# Altium footprint library Wurth_Elektronik_Electromechanic_Wire_to_Board_Connectors_rev16a.PCBLIB: 662 footprints (part 30 of 42)
Each footprint in its own frame and in the unit in brackets; x right, y up, seen from the top. Pads: shape width x height; smd on the part's side, far side on the other; paste and mask are expansions set on the pad; w line width, h text height; cw(c..) or ccw(c..) is an arc to the next point about the centre after c.
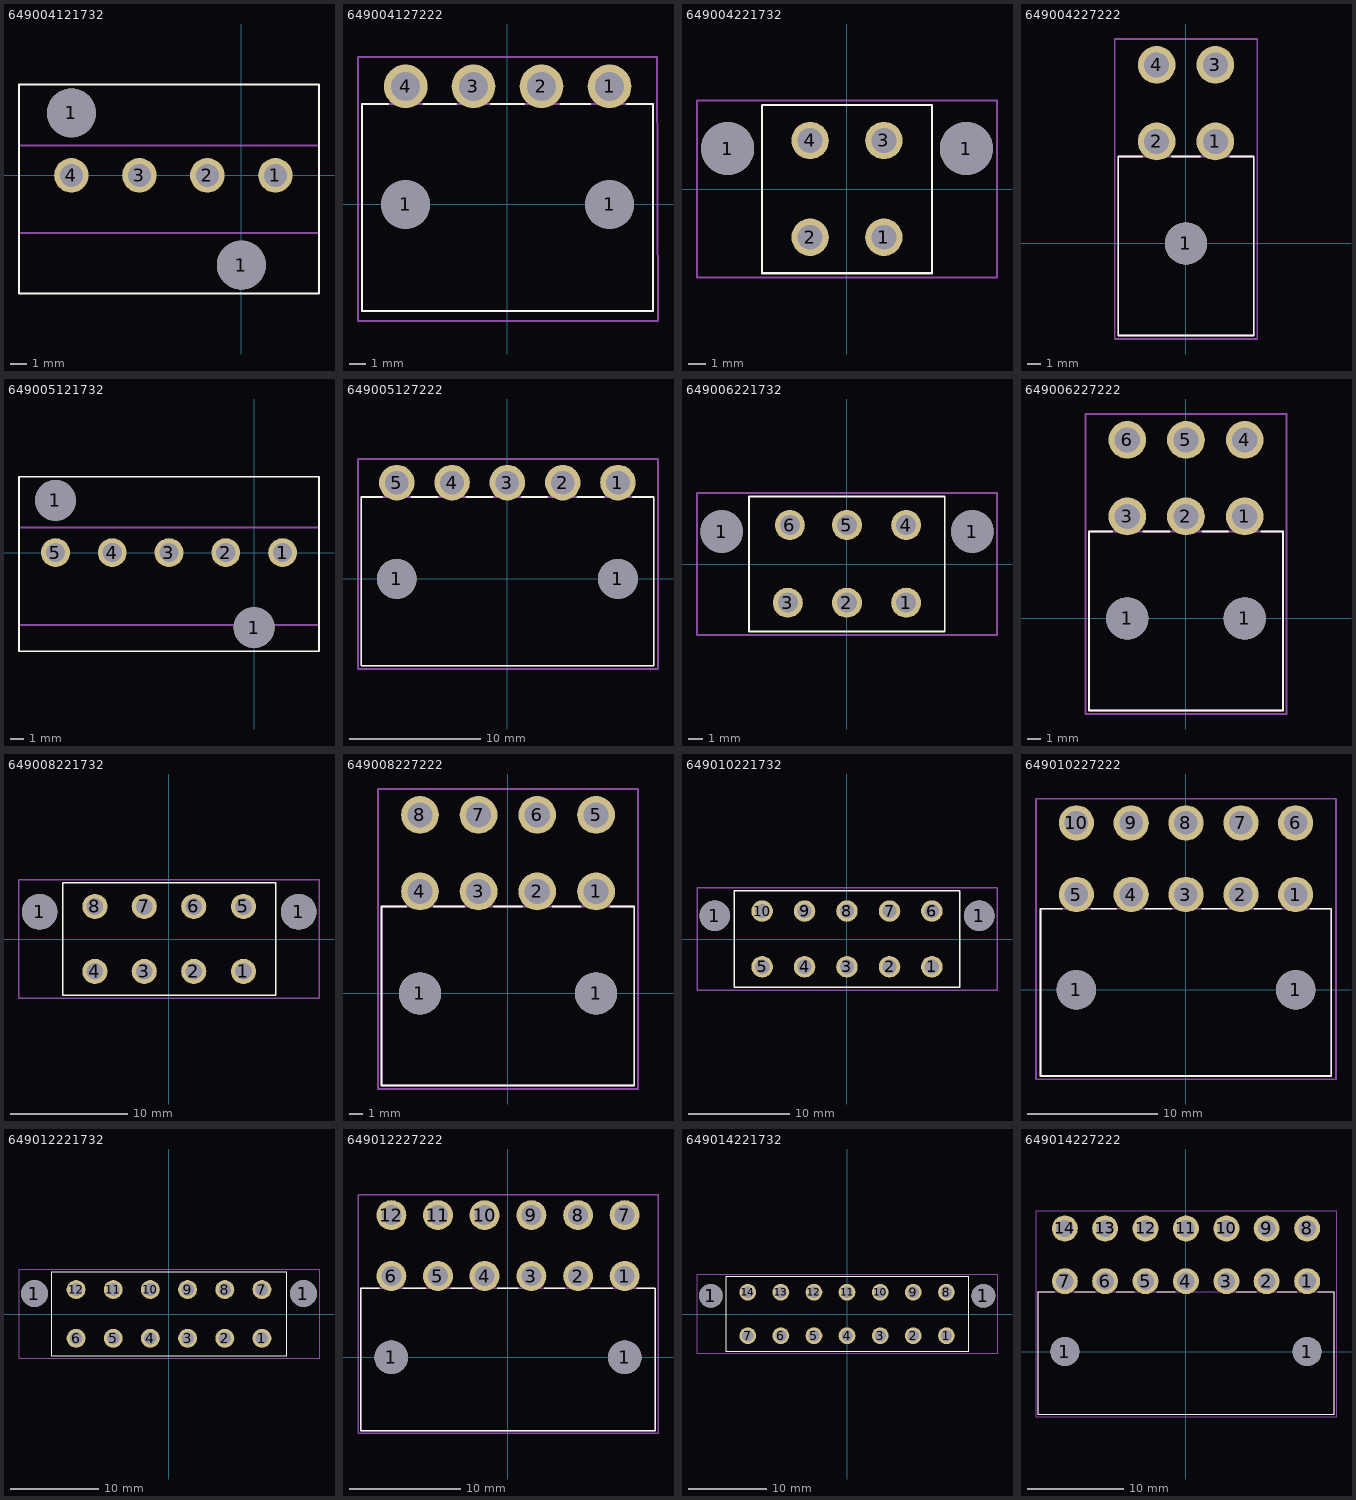
[diagram p29: the footprints below, top view; thin cyan lines are the x and y axes]

## 649004121732 [mil]
pads (6):
  round 119 hole 119: 1(-413.39,152) 1(0,-218.5)
  round 84 hole 56: 1(83,0) 2(-82.68,0) 3(-248.03,0) 4(-413.39,0)
Top Overlay:
  lines w5: -540.94,-287.4 189,-287.4 189,221 -540.94,221 -540.94,-287.4
Mechanical 2:
  text ">NAME" at -300,250 h77.5
Mechanical 4:
  text ">VALUE" at -300,-350 h77.5
Mechanical 16:
  lines w5: -540.94,-139.76 189,-139.76 189,73 -540.94,73 -540.94,-139.76
  text "1" at 75,-25 h77.5
  text "4" at -434.65,-25 h77.5

## 649004127222 [mil]
pads (6):
  round 119 hole 119: 1(-248.03,0) 1(249,0)
  round 106.5 hole 71: 1(249,288) 2(83,288) 3(-82.68,288) 4(-248.03,288)
Top Overlay:
  lines w5: -291.34,245 -354.33,245 -354.33,-259.84 355,-259.84 355,245 292,245 ; -204.72,245 -125.98,245 ; -39.37,245 40,245 ; 130,245 201,245
Mechanical 2:
  text ">NAME" at -109.65,388 h77.5
Mechanical 4:
  text ">VALUE" at -134.65,-362.6 h77.5
Mechanical 16:
  lines w5: -354.33,-259.84 -354.33,245 355,245 355,-259.84 -354.33,-259.84
  text "1" at 241,263 h77.5
  text "4" at -259.65,263 h77.5
Mechanical 27:
  lines w5: -364.17,-283.46 367,-283.46 365,359 -364.17,359 -364.17,-283.46

## 649004221732 [mil]
pads (6):
  round 119 hole 119: 1(-267.72,91) 1(268,91)
  round 84 hole 56: 1(83,-108.27) 2(-82.68,-108.27) 3(83,109) 4(-82.68,109)
Top Overlay:
  lines w5: -190.94,-188.98 191,-188.98 191,189 -190.94,189 -190.94,-188.98
Mechanical 2:
  text ">NAME" at -100.59,217 h77.5
Mechanical 4:
  text ">VALUE" at -142.72,-277.36 h77.5
Mechanical 16:
  text "1" at 58,-125 h77.5
  text "4" at -107.68,85 h77.5
Mechanical 27:
  lines w5: -336.61,-198.82 337,-198.82 337,199 -336.61,199 -336.61,-198.82

## 649004227222 [mil]
pads (5):
  round 119 hole 119: 1(0,0)
  round 106.5 hole 71: 1(83,288) 2(-82.68,288) 3(83,504) 4(-82.68,504)
Top Overlay:
  lines w5: -124.02,245 -190.94,245 -190.94,-259.84 191,-259.84 191,245 126,245 ; -39.37,245 40,245
Mechanical 2:
  text ">NAME" at -479.04,37 h77.5
Mechanical 4:
  text ">VALUE" at -500,-54.33 h77.5
Mechanical 16:
  lines w5: -190.94,-259.84 191,-259.84 191,245 -190.94,245 -190.94,-259.84
  text "1" at 78,264 h77.5
  text "4" at -107.68,477 h77.5
Mechanical 27:
  lines w5: -200.79,-269.69 201,-269.69 201,577 -200.79,577 -200.79,-269.69

## 649005121732 [mil]
pads (7):
  round 119 hole 119: 1(-578.74,152) 1(0,-218.5)
  round 84 hole 56: 1(83,0) 2(-82.68,0) 3(-248.03,0) 4(-413.39,0) 5(-578.74,0)
Top Overlay:
  lines w5: -685.04,-287.4 189,-287.4 189,221 -685.04,221 -685.04,-287.4
Mechanical 2:
  text ">NAME" at -375,250 h77.5
Mechanical 4:
  text ">VALUE" at -400,-350 h77.5
Mechanical 16:
  lines w5: -685.04,-210.63 189,-210.63 189,73 -685.04,73 -685.04,-210.63
  text "1" at 75,-25 h77.5
  text "5" at -584.65,-25 h77.5

## 649005127222 [mil]
pads (7):
  round 119 hole 119: 1(-330.71,0) 1(331,0)
  round 106.5 hole 71: 1(331,288) 2(166,288) 3(0,288) 4(-165.35,288) 5(-330.71,288)
Top Overlay:
  lines w5: -374.02,245 -437.01,245 -437.01,-259.84 438,-259.84 438,245 375,245 ; -287.4,245 -208.66,245 ; -122.05,245 -43.31,245 ; 44,245 119,245 ; 209,245 288,245
Mechanical 2:
  text ">NAME" at -151.97,388 h77.5
Mechanical 4:
  text ">VALUE" at -151.97,-340.16 h77.5
Mechanical 16:
  lines w5: -437.01,-259.84 -437.01,245 438,245 438,-259.84 -437.01,-259.84
  text "1" at 324,263 h77.5
  text "5" at -351.97,263 h77.5
Mechanical 27:
  lines w5: -446.85,-269.69 451,-269.69 451,359 -446.85,359 -446.85,-269.69

## 649006221732 [mil]
pads (8):
  round 119 hole 119: 1(-350.39,91) 1(351,91)
  round 84 hole 56: 1(166,-108.27) 2(0,-108.27) 3(-165.35,-108.27) 4(166,109) 5(0,109) 6(-159.65,109)
Top Overlay:
  lines w5: -273.62,-188.98 274,-188.98 274,189 -273.62,189 -273.62,-188.98
Mechanical 2:
  text ">NAME" at -137.6,225 h77.5
Mechanical 4:
  text ">VALUE" at -142.91,-273.43 h77.5
Mechanical 16:
  text "1" at 141,-125 h77.5
  text "6" at -175,85 h77.5
Mechanical 27:
  lines w5: -419.29,-198.82 420,-198.82 420,199 -419.29,199 -419.29,-198.82

## 649006227222 [mil]
pads (8):
  round 119 hole 119: 1(-165.35,0) 1(166,0)
  round 106.5 hole 71: 1(166,288) 2(0,288) 3(-165.35,288) 4(166,504) 5(0,504) 6(-165.35,504)
Top Overlay:
  lines w5: -208.66,245 -273.62,245 -273.62,-259.84 274,-259.84 274,245 213,245 ; -120.08,245 -45.28,245 ; 46,245 119,245
Mechanical 2:
  text ">NAME" at -628.44,37 h77.5
Mechanical 4:
  text ">VALUE" at -628.44,-42.62 h77.5
Mechanical 16:
  lines w5: -273.62,-259.84 274,-259.84 274,245 -273.62,245 -273.62,-259.84
  text "6" at -192.91,471 h77.5
  text "1" at 161,264 h77.5
Mechanical 27:
  lines w5: -283.46,-269.69 284,-269.69 284,577 -283.46,577 -283.46,-269.69

## 649008221732 [mil]
pads (10):
  round 119 hole 119: 1(-433.07,91) 1(434,91)
  round 84 hole 56: 1(249,-108.27) 2(83,-108.27) 3(-82.68,-108.27) 4(-248.03,-108.27) 5(249,109) 6(83,109) 7(-82.68,109) 8(-248.03,109)
Top Overlay:
  lines w5: -356.3,-188.98 357,-188.98 357,189 -356.3,189 -356.3,-188.98
Mechanical 2:
  text ">NAME" at -110.24,217 h77.5
Mechanical 4:
  text ">VALUE" at -143.11,-265.55 h77.5
Mechanical 16:
  text "1" at 224,-125 h77.5
  text "8" at -267.32,85 h77.5
Mechanical 27:
  lines w5: -501.97,-198.82 502,-198.82 502,199 -501.97,199 -501.97,-198.82

## 649008227222 [mil]
pads (10):
  round 119 hole 119: 1(-248.03,0) 1(249,0)
  round 106.5 hole 71: 1(249,288) 2(83,288) 3(-82.68,288) 4(-248.03,288) 5(249,504) 6(83,504) 7(-82.68,504) 8(-248.03,504)
Top Overlay:
  lines w5: -287.4,245 -356.3,245 -356.3,-259.84 357,-259.84 357,245 ; -208.66,245 -124.02,245 ; -39.37,245 40,245 ; 126,245 205,245 ; 290,245 355,245
Mechanical 2:
  text ">NAME" at -638.68,37 h77.5
Mechanical 4:
  text ">VALUE" at -663.68,-42.62 h77.5
Mechanical 16:
  lines w5: -356.3,-259.84 357,-259.84 357,245 -356.3,245 -356.3,-259.84
  text "8" at -260.24,471 h77.5
  text "1" at 161,264 h77.5
Mechanical 27:
  lines w5: -366.14,-269.69 367,-269.69 367,577 -366.14,577 -366.14,-269.69

## 649010221732 [mil]
pads (12):
  round 119 hole 119: 1(-515.75,91) 1(516,91)
  round 84 hole 56: 1(331,-108.27) 2(166,-108.27) 3(0,-108.27) 4(-165.35,-108.27) 5(-330.71,-108.27) 6(331,109) 7(166,109) 8(0,109) 9(-165.35,109) 10(-330.71,109)
Top Overlay:
  lines w5: -438.98,-188.98 439,-188.98 439,189 -438.98,189 -438.98,-188.98
Mechanical 2:
  text ">NAME" at -102.56,245 h77.5
Mechanical 4:
  text ">VALUE" at -119.69,-289.17 h77.5
Mechanical 16:
  text "1" at 306,-125 h77.5
  text "10" at -384.65,85 h77.5
Mechanical 27:
  lines w5: -584.65,-198.82 585,-198.82 585,199 -584.65,199 -584.65,-198.82

## 649010227222 [mil]
pads (12):
  round 119 hole 119: 1(-330.71,0) 1(331,0)
  round 106.5 hole 71: 1(331,288) 2(166,288) 3(0,288) 4(-165.35,288) 5(-330.71,288) 6(331,504) 7(166,504) 8(0,504) 9(-165.35,504) 10(-330.71,504)
Top Overlay:
  lines w5: -374.02,245 -438.98,245 -438.98,-259.84 439,-259.84 439,245 375,245 ; -285.43,245 -210.63,245 ; -122.05,245 -43.31,245 ; 48,245 123,245 ; 207,245 288,245
Mechanical 2:
  text ">NAME" at -721.36,37 h77.5
Mechanical 4:
  text ">VALUE" at -746.36,-42.62 h77.5
Mechanical 16:
  lines w5: -438.98,-259.84 439,-259.84 439,245 -438.98,245 -438.98,-259.84
  text "10" at -377.56,471 h77.5
  text "1" at 326,264 h77.5
Mechanical 27:
  lines w5: -452.76,-269.69 453,-269.69 453,577 -452.76,577 -452.76,-269.69

## 649012221732 [mil]
pads (14):
  round 119 hole 119: 1(-598.43,91) 1(599,91)
  round 84 hole 56: 1(414,-108.27) 2(249,-108.27) 3(83,-108.27) 4(-82.68,-108.27) 5(-248.03,-108.27) 6(-413.39,-108.27) 7(414,109) 8(249,109) 9(83,109) 10(-82.68,109) 11(-248.03,109) 12(-413.39,109)
Top Overlay:
  lines w5: -521.65,-188.98 522,-188.98 522,189 -521.65,189 -521.65,-188.98
Mechanical 2:
  text ">NAME" at -15.94,233 h77.5
Mechanical 4:
  text ">VALUE" at -44.88,-277.36 h77.5
Mechanical 16:
  text "1" at 389,-125 h77.5
  text "12" at -451.97,85 h77.5
Mechanical 27:
  lines w5: -667.32,-198.82 668,-198.82 668,199 -667.32,199 -667.32,-198.82

## 649012227222 [mil]
pads (14):
  round 119 hole 119: 1(-413.39,0) 1(414,0)
  round 106.5 hole 71: 1(414,288) 2(249,288) 3(83,288) 4(-82.68,288) 5(-248.03,288) 6(-413.39,288) 7(414,504) 8(249,504) 9(83,504) 10(-82.68,504) 11(-248.03,504) 12(-413.39,504)
Top Overlay:
  lines w5: -456.69,245 -521.65,245 -521.65,-259.84 522,-259.84 522,245 ; -372.05,245 -291.34,245 ; -202.76,245 -125.98,245 ; -37.4,245 36,245 ; 128,245 201,245 ; 294,245 371,245 ; 457,245 520,245
Mechanical 2:
  text ">NAME" at -813.68,12 h77.5
Mechanical 4:
  text ">VALUE" at -838.68,-67.62 h77.5
Mechanical 16:
  lines w5: -521.65,-259.84 522,-259.84 522,245 -521.65,245 -521.65,-259.84
  text "12" at -444.88,471 h77.5
  text "1" at 409,347 h77.5
Mechanical 27:
  lines w5: -531.5,-269.69 532,-269.69 532,577 -531.5,577 -531.5,-269.69

## 649014221732 [mil]
pads (16):
  round 119 hole 119: 1(-681.1,91) 1(682,91)
  round 84 hole 56: 1(497,-108.27) 2(331,-108.27) 3(166,-108.27) 4(0,-108.27) 5(-165.35,-108.27) 6(-330.71,-108.27) 7(-496.06,-108.27) 8(497,109) 9(331,109) 10(166,109) 11(0,109) 12(-165.35,109) 13(-330.71,109) 14(-496.06,109)
Top Overlay:
  lines w5: -604.33,-188.98 605,-188.98 605,189 -604.33,189 -604.33,-188.98
Mechanical 2:
  text ">NAME" at -133.27,237 h77.5
Mechanical 4:
  text ">VALUE" at -158.27,-273.43 h77.5
Mechanical 16:
  text "1" at 472,-125 h77.5
  text "14" at -544.29,85 h77.5
Mechanical 27:
  lines w5: -750,-198.82 750,-198.82 750,199 -750,199 -750,-198.82

## 649014227222 [mil]
pads (16):
  round 119 hole 119: 1(-496.06,0) 1(497,0)
  round 106.5 hole 71: 1(497,288) 2(331,288) 3(166,288) 4(0,288) 5(-165.35,288) 6(-330.71,288) 7(-496.06,288) 8(497,504) 9(331,504) 10(166,504) 11(0,504) 12(-165.35,504) 13(-330.71,504) 14(-496.06,504)
Top Overlay:
  lines w5: -539.37,245 -604.33,245 -604.33,-259.84 605,-259.84 605,245 ; -454.72,245 -372.05,245 ; -285.43,245 -210.63,245 ; -120.08,245 -43.31,245 ; 207,245 288,245 ; 375,245 455,245 ; 540,245 603,245
Mechanical 2:
  text ">NAME" at -881,-13.19 h77.5
Mechanical 4:
  text ">VALUE" at -906,-92.62 h77.5
Mechanical 16:
  lines w5: -604.33,-259.84 605,-259.84 605,245 -604.33,245 -604.33,-259.84
  text "14" at -537.2,471 h77.5
  text "1" at 491,264 h77.5
Mechanical 27:
  lines w5: -614.17,-269.69 615,-269.69 615,577 -614.17,577 -614.17,-269.69